# Altium footprint library Libreria PCB.PcbLib: 96 footprints (part 3 of 6)
Each footprint in its own frame and in the unit in brackets; x right, y up, seen from the top. Pads: shape width x height; smd on the part's side, far side on the other; paste and mask are expansions set on the pad; w line width, h text height; cw(c..) or ccw(c..) is an arc to the next point about the centre after c.
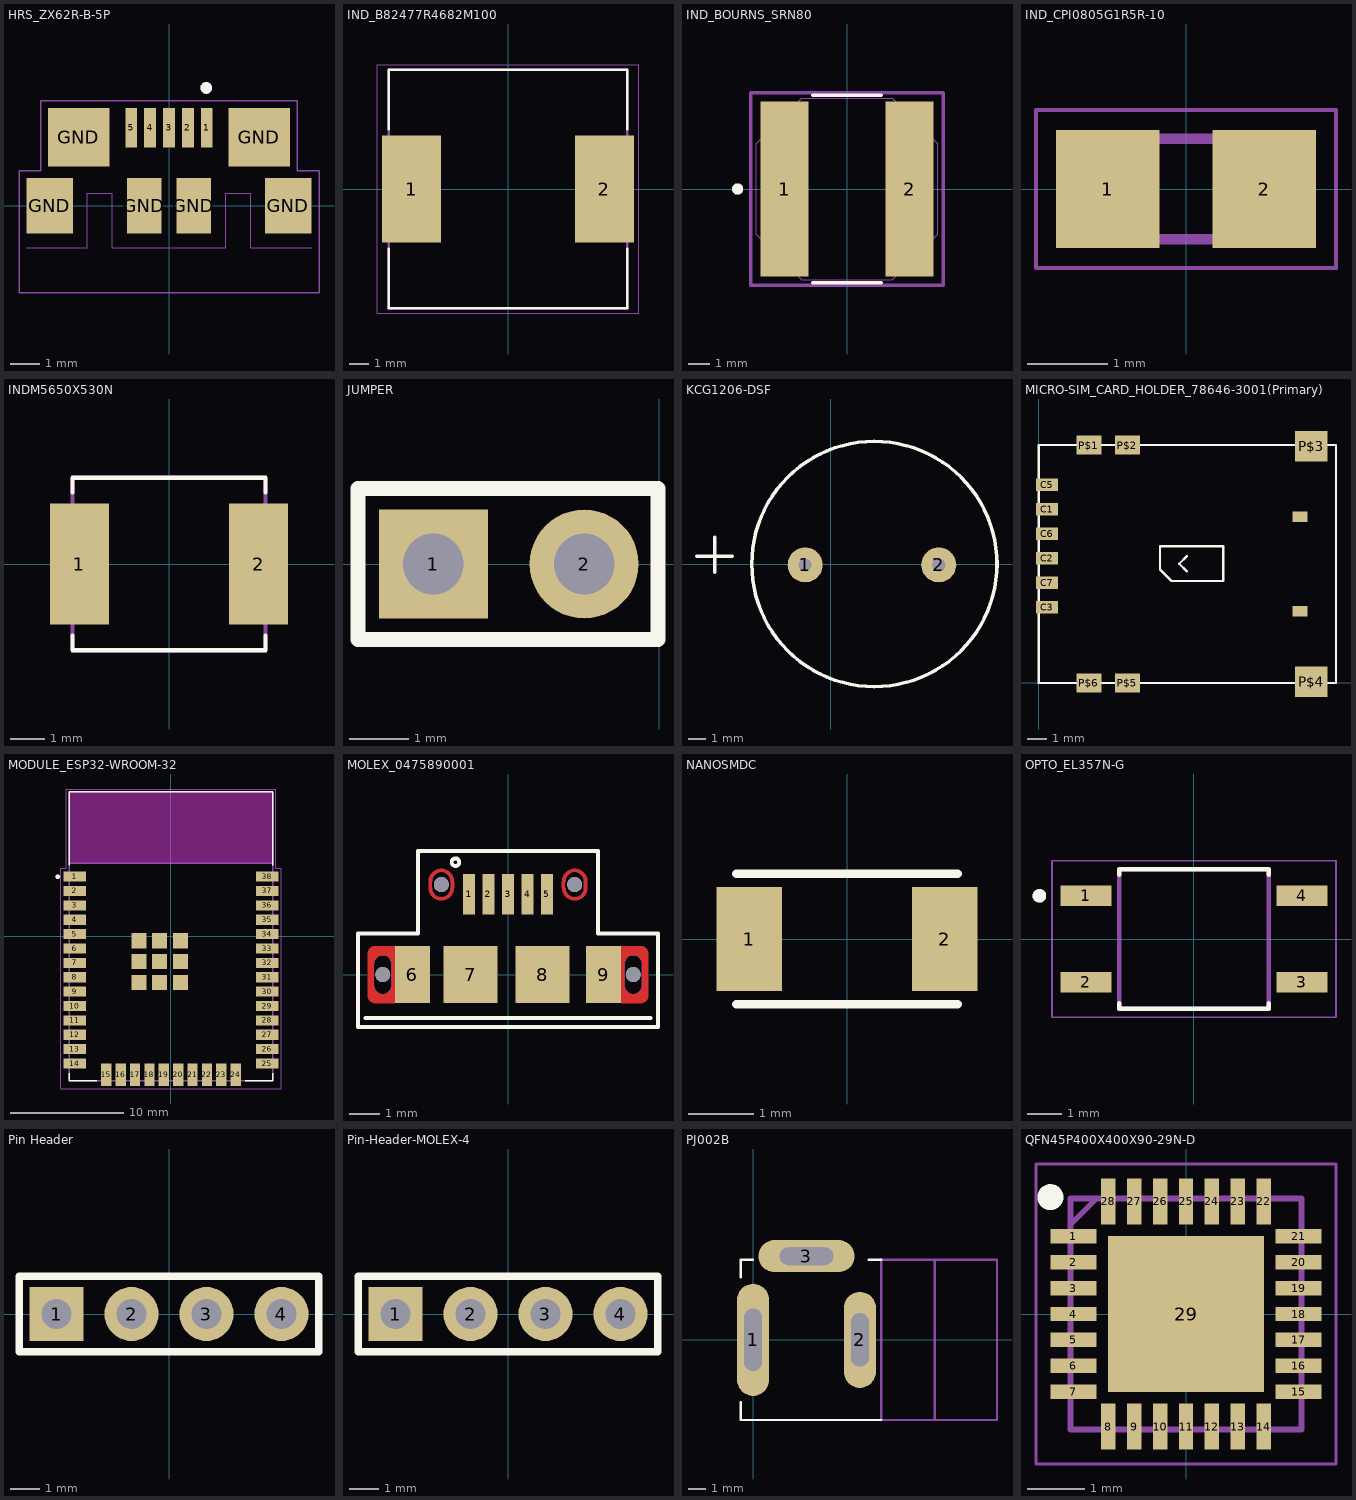
[diagram p2: the footprints below, top view; thin cyan lines are the x and y axes]

## HRS_ZX62R-B-5P [mm]
pads (11):
  rect 0.4x1.35 smd: 1(1.3,2.675) 2(0.65,2.675) 3(0,2.675) 4(-0.65,2.675) 5(-1.3,2.675)
  rect 1.6x1.9 smd: GND(-4.1,0) GND(4.1,0)
  rect 2.1x2 smd: GND(-3.1,2.35) GND(3.1,2.35)
  rect 1.2x1.9 smd: GND(-0.85,0) GND(0.85,0)
Top Overlay:
  circle w0.2: c1.28,4.04 r0.1
Mechanical 1:
  lines w0: -4.9,-1.45 -2.8,-1.45 -2.8,0.43 -1.95,0.43 -1.95,-1.45 1.95,-1.45 1.95,0.43 2.8,0.43 2.8,-1.45 4.9,-1.45
Mechanical 13:
  circle w0.2: c1.28,4.04 r0.1
Mechanical 15:
  lines w0.05: -5.15,-3 5.15,-3 5.15,1.2 4.4,1.2 4.4,3.6 -4.4,3.6 -4.4,1.2 -5.15,1.2 -5.15,-3
3D body "ZX62R-B-5P--3DModel-STEP-1.STEP": height 2.71, standoff -0.23, extent -4.4,-2.75 4.4,2.981

## IND_B82477R4682M100 [mm]
height 8.5
pads (2):
  rect 3.1x5.6 smd: 1(-5.05,0) 2(5.05,0)
Top Overlay:
  lines w0.127: -6.25,-3.12 -6.25,-6.25 6.25,-6.25 6.25,-3.12 ; -6.25,3.12 -6.25,6.25 6.25,6.25 6.25,3.12
Mechanical 13:
  lines w0.127: -6.25,-6.25 -6.25,6.25 6.25,6.25 6.25,-6.25 -6.25,-6.25
Mechanical 15:
  lines w0.05: -6.85,-6.5 -6.85,6.5 6.85,6.5 6.85,-6.5 -6.85,-6.5
3D body "step_temp.STEP": height 8.5, standoff 0, extent -6.25,-6.25 6.25,6.25

## IND_BOURNS_SRN80 [mil]
pads (2):
  rect 87x315 smd paste+0 mask+0: 1(-112.5,0) 2(112.5,0)
Top Overlay:
  circle w10: c-196.85,0 r5
  lines w6: -61.89,-168.5 61.89,-168.5 ; -61.89,168.5 61.89,168.5
Mechanical 13:
  lines w1: -163.5,-81.75 -163.5,81.75 -81.75,163.5 81.75,163.5 163.5,81.75 163.5,-81.75 81.75,-163.5 -81.75,-163.5 -163.5,-81.75
  text "*" at -143.5,0 h50
Mechanical 15:
  lines w6: -173.5,-173.5 -173.5,173.5 173.5,173.5 173.5,-173.5 -173.5,-173.5
3D body "srn8040.stp": height 157.48, standoff 0, extent -157.48,-157.48 157.49,157.48

## IND_CPI0805G1R5R-10 [mm]
pads (2):
  rect 1.285x1.47 smd: 1(-0.973,0) 2(0.973,0)
Mechanical 13:
  lines w0.127: -1,-0.625 1,-0.625 1,0.625 -1,0.625 -1,-0.625
Mechanical 15:
  lines w0.05: -1.865,-0.985 1.865,-0.985 1.865,0.985 -1.865,0.985 -1.865,-0.985
3D body "step_temp.STEP": height 1, standoff 0, extent -1,-0.625 1,0.625

## INDM5650X530N [mm]
height 5.3
pads (2):
  rect 1.71x3.51 smd: 1(-2.6,0) 2(2.6,0)
Top Overlay:
  lines w0.127: -2.8,-2.075 -2.8,-2.5 2.8,-2.5 2.8,-2.075 ; -2.8,2.075 -2.8,2.5 2.8,2.5 2.8,2.075
Mechanical 13:
  lines w0.127: -2.8,-2.5 -2.8,2.5 2.8,2.5 2.8,-2.5 -2.8,-2.5
3D body "step_temp.STEP": height 5.3, standoff 0, extent -2.927,-2.667 2.673,2.333

## JUMPER [mm] "2.54 mm pitch male header pin"
pads (2):
  rect 1.836x1.836 hole 1.02: 1(-3.81,0)
  round 1.836 hole 1.02: 2(-1.27,0)
Top Overlay:
  lines w0.254: -5.08,-1.275 -0.025,-1.275 -0.025,1.275 -5.08,1.275 -5.08,-1.275
3D body "Jumper SL2.STEP": height 9.5, standoff -2.6, extent -5.05,-1.225 -0.05,1.315

## KCG1206-DSF [mm]
pads (2):
  round 2 hole 0.75: 1(-1.45,-0.05) 2(6.175,-0.05)
Top Overlay:
  circle w0.2: c2.5,0 r7
  lines w0.2: -7.625,0.45 -5.625,0.45 ; -6.625,-0.475 -6.625,1.525
3D body "ALSRobot-BUZZER.STEP": height 9.65, standoff -4.5, extent -7.054,-6.025 8.4,5.975

## MICRO-SIM_CARD_HOLDER_78646-3001(Primary) [mm]
pads (14):
  rect 1.15x0.65 smd: C1(0.43,9.025) C2(0.43,6.485) C3(0.43,3.945) C5(0.43,10.295) C6(0.43,7.755) C7(0.43,5.215)
  rect 1.3x1 smd: P$1(2.6,12.37) P$2(4.6,12.37) P$5(4.6,0) P$6(2.6,0)
  rect 1.7x1.6 smd: P$3(14.16,12.31) P$4(14.16,0.06)
  rect 0.8x0.54 smd: P$13(13.58,3.73) P$14(13.58,8.65)
Top Overlay:
  lines w0.127: 7.7,5.8 7.3,6.2 7.7,6.6 ; 0,0 15.45,0 15.45,12.37 0,12.37 0,0 ; 6.3,5.9 6.3,7.1 9.6,7.1 9.6,5.3 6.9,5.3 6.3,5.9
3D body "786463001.stp": height 1.43, standoff -0.02, extent 0,-0.254 15.45,12.796

## MODULE_ESP32-WROOM-32 [mm]
pads (47):
  rect 2x0.9 smd: 1(-8.5,5.26) 2(-8.5,3.99) 3(-8.5,2.72) 4(-8.5,1.45) 5(-8.5,0.18) 6(-8.5,-1.09) 7(-8.5,-2.36) 8(-8.5,-3.63) 9(-8.5,-4.9) 10(-8.5,-6.17) 11(-8.5,-7.44) 12(-8.5,-8.71) 13(-8.5,-9.98) 14(-8.5,-11.25) 25(8.5,-11.25) 26(8.5,-9.98) 27(8.5,-8.71) 28(8.5,-7.44) 29(8.5,-6.17) 30(8.5,-4.9) 31(8.5,-3.63) 32(8.5,-2.36) 33(8.5,-1.09) 34(8.5,0.18) 35(8.5,1.45) 36(8.5,2.72) 37(8.5,3.99) 38(8.5,5.26)
  rect 0.9x2 smd: 15(-5.715,-12.25) 16(-4.445,-12.25) 17(-3.175,-12.25) 18(-1.905,-12.25) 19(-0.635,-12.25) 20(0.635,-12.25) 21(1.905,-12.25) 22(3.175,-12.25) 23(4.445,-12.25) 24(5.715,-12.25)
  rect 1.33x1.33 smd: 39_1(-2.835,-0.405) 39_2(-1,-0.405) 39_3(0.835,-0.405) 39_4(-2.835,-2.24) 39_5(-1,-2.24) 39_6(0.835,-2.24) 39_7(-2.835,-4.075) 39_8(-1,-4.075) 39_9(0.835,-4.075)
Top Overlay:
  circle w0.2: c-10,5.25 r0.1
  lines w0.127: -9,-12.1 -9,-12.75 -6.55,-12.75 ; -9,6.25 -9,12.75 9,12.75 9,6.25 ; 6.55,-12.75 9,-12.75 9,-12.1
Keep-Out Layer:
  region: 9,6.45 -9,6.45 -9,12.75 9,12.75
  region: 9,6.45 -9,6.45 -9,12.75 9,12.75
Mechanical 13:
  circle w0.2: c-10,5.25 r0.1
  lines w0.127: -9,6.45 -9,-12.75 9,-12.75 9,6.45 ; -9,6.45 -9,12.75 9,12.75 9,6.45 ; -9,6.45 9,6.45
  text "ANTENNA" at -6,9 h1.78
Mechanical 15:
  lines w0.05: -9.75,-13.5 9.75,-13.5 9.75,6 9.25,6 9.25,13 -9.25,13 -9.25,6 -9.75,6 -9.75,-13.5
3D body "step_temp.STEP": height 3.2, standoff 0, extent -9,-12.75 9,12.75

## MOLEX_0475890001 [mm]
pads (13):
  rect 0.4x1.35 smd: 1(-1.3,2.675) 2(-0.65,2.675) 3(0,2.675) 4(0.65,2.675) 5(1.3,2.675)
  rect 1.175x1.9 smd: 6(-3.187,0) 9(3.187,0)
  rect 1.8x1.9 smd: 7(-1.25,0) 8(1.15,0)
  round 0.5 hole 0.5 unplated: ""(-4.175,0) ""(-2.225,3) ""(2.225,3) ""(4.175,0)
Top Layer:
  region: 3.875,0.35 3.875,-0.35 3.875,-0.95 3.775,-0.95 3.775,0.95 3.875,0.95
  region: 186 vertices and 0 holes, not listed, extent 3.875,-0.95 4.675,0.95
  region: -3.775,-0.95 -3.875,-0.95 -3.875,-0.35 -3.875,0.35 -3.875,0.95 -3.775,0.95
  region: 2.65,2.9 2.649,2.878 2.648,2.856 2.645,2.834 2.641,2.812 2.636,2.79 2.629,2.769 2.622,2.748 2.613,2.727 2.604,2.707 2.593,2.688 2.581,2.669 2.569,2.65 2.555,2.633 2.541,2.616 2.526,2.599 2.509,2.584 2.492,2.57 2.475,2.556 2.456,2.544 2.438,2.532 2.418,2.521 2.398,2.512 2.377,2.503 2.356,2.496 2.335,2.489 2.313,2.484 2.291,2.48 2.269,2.477 2.247,2.476 2.225,2.475 2.203,2.476 2.181,2.477 2.159,2.48 2.137,2.484 2.115,2.489 2.094,2.496 2.073,2.503 2.052,2.512 2.032,2.521 2.013,2.532 1.994,2.544 1.975,2.556 1.958,2.57 1.941,2.584 1.924,2.599 1.909,2.616 1.895,2.633 1.881,2.65 1.869,2.669 1.857,2.688 1.846,2.707 1.837,2.727 1.828,2.748 1.821,2.769 1.814,2.79 1.809,2.812 1.805,2.834 1.802,2.856 1.801,2.878 1.8,2.9 1.8,3 1.9,3 1.9,2.9 1.9,2.883 1.902,2.866 1.904,2.849 1.907,2.832 1.911,2.816 1.916,2.8 1.922,2.784 1.928,2.768 1.935,2.752 1.944,2.738 1.952,2.723 1.962,2.709 1.972,2.695 1.983,2.683 1.995,2.67 2.008,2.658 2.02,2.647 2.034,2.637 2.048,2.627 2.063,2.619 2.077,2.61 2.093,2.603 2.109,2.597 2.125,2.591 2.141,2.586 2.157,2.582 2.174,2.579 2.191,2.577 2.208,2.575 2.225,2.575 2.242,2.575 2.259,2.577 2.276,2.579 2.293,2.582 2.309,2.586 2.325,2.591 2.341,2.597 2.357,2.603 2.373,2.61 2.388,2.619 2.402,2.627 2.416,2.637 2.43,2.647 2.442,2.658 2.455,2.67 2.467,2.683 2.478,2.695 2.488,2.709 2.498,2.723 2.506,2.738 2.515,2.752 2.522,2.768 2.528,2.784 2.534,2.8 2.539,2.816 2.543,2.832 2.546,2.849 2.548,2.866 2.55,2.883 2.55,2.9 2.55,3 2.65,3
  region: 2.247,3.524 2.269,3.523 2.291,3.52 2.313,3.516 2.335,3.511 2.356,3.504 2.377,3.497 2.398,3.488 2.418,3.479 2.438,3.468 2.456,3.456 2.475,3.444 2.492,3.43 2.509,3.416 2.526,3.401 2.541,3.384 2.555,3.367 2.569,3.35 2.581,3.331 2.593,3.313 2.604,3.293 2.613,3.273 2.622,3.252 2.629,3.231 2.636,3.21 2.641,3.188 2.645,3.166 2.648,3.144 2.649,3.122 2.65,3.1 2.65,3 2.55,3 2.55,3.1 2.55,3.117 2.548,3.134 2.546,3.151 2.543,3.168 2.539,3.184 2.534,3.2 2.528,3.216 2.522,3.232 2.515,3.248 2.506,3.263 2.498,3.277 2.488,3.291 2.478,3.305 2.467,3.317 2.455,3.33 2.442,3.342 2.43,3.353 2.416,3.363 2.402,3.373 2.388,3.381 2.373,3.39 2.357,3.397 2.341,3.403 2.325,3.409 2.309,3.414 2.293,3.418 2.276,3.421 2.259,3.423 2.242,3.425 2.225,3.425 2.208,3.425 2.191,3.423 2.174,3.421 2.157,3.418 2.141,3.414 2.125,3.409 2.109,3.403 2.093,3.397 2.077,3.39 2.063,3.381 2.048,3.373 2.034,3.363 2.02,3.353 2.008,3.342 1.995,3.33 1.983,3.317 1.972,3.305 1.962,3.291 1.952,3.277 1.944,3.263 1.935,3.248 1.928,3.232 1.922,3.216 1.916,3.2 1.911,3.184 1.907,3.168 1.904,3.151 1.902,3.134 1.9,3.117 1.9,3.1 1.9,3 1.8,3 1.8,3.1 1.801,3.122 1.802,3.144 1.805,3.166 1.809,3.188 1.814,3.21 1.821,3.231 1.828,3.252 1.837,3.273 1.846,3.293 1.857,3.313 1.869,3.331 1.881,3.35 1.895,3.367 1.909,3.384 1.924,3.401 1.941,3.416 1.958,3.43 1.975,3.444 1.994,3.456 2.013,3.468 2.032,3.479 2.052,3.488 2.073,3.497 2.094,3.504 2.115,3.511 2.137,3.516 2.159,3.52 2.181,3.523 2.203,3.524 2.225,3.525
  region: -1.8,2.9 -1.801,2.878 -1.802,2.856 -1.805,2.834 -1.809,2.812 -1.814,2.79 -1.821,2.769 -1.828,2.748 -1.837,2.727 -1.846,2.707 -1.857,2.688 -1.869,2.669 -1.881,2.65 -1.895,2.633 -1.909,2.616 -1.924,2.599 -1.941,2.584 -1.958,2.57 -1.975,2.556 -1.994,2.544 -2.013,2.532 -2.032,2.521 -2.052,2.512 -2.073,2.503 -2.094,2.496 -2.115,2.489 -2.137,2.484 -2.159,2.48 -2.181,2.477 -2.203,2.476 -2.225,2.475 -2.247,2.476 -2.269,2.477 -2.291,2.48 -2.313,2.484 -2.335,2.489 -2.356,2.496 -2.377,2.503 -2.398,2.512 -2.418,2.521 -2.438,2.532 -2.456,2.544 -2.475,2.556 -2.492,2.57 -2.509,2.584 -2.526,2.599 -2.541,2.616 -2.555,2.633 -2.569,2.65 -2.581,2.669 -2.593,2.688 -2.604,2.707 -2.613,2.727 -2.622,2.748 -2.629,2.769 -2.636,2.79 -2.641,2.812 -2.645,2.834 -2.648,2.856 -2.649,2.878 -2.65,2.9 -2.65,3 -2.55,3 -2.55,2.9 -2.55,2.883 -2.548,2.866 -2.546,2.849 -2.543,2.832 -2.539,2.816 -2.534,2.8 -2.528,2.784 -2.522,2.768 -2.515,2.752 -2.506,2.738 -2.498,2.723 -2.488,2.709 -2.478,2.695 -2.467,2.683 -2.455,2.67 -2.442,2.658 -2.43,2.647 -2.416,2.637 -2.402,2.627 -2.388,2.619 -2.373,2.61 -2.357,2.603 -2.341,2.597 -2.325,2.591 -2.309,2.586 -2.293,2.582 -2.276,2.579 -2.259,2.577 -2.242,2.575 -2.225,2.575 -2.208,2.575 -2.191,2.577 -2.174,2.579 -2.157,2.582 -2.141,2.586 -2.125,2.591 -2.109,2.597 -2.093,2.603 -2.077,2.61 -2.063,2.619 -2.048,2.627 -2.034,2.637 -2.02,2.647 -2.008,2.658 -1.995,2.67 -1.983,2.683 -1.972,2.695 -1.962,2.709 -1.952,2.723 -1.944,2.738 -1.935,2.752 -1.928,2.768 -1.922,2.784 -1.916,2.8 -1.911,2.816 -1.907,2.832 -1.904,2.849 -1.902,2.866 -1.9,2.883 -1.9,2.9 -1.9,3 -1.8,3
  region: -2.203,3.524 -2.181,3.523 -2.159,3.52 -2.137,3.516 -2.115,3.511 -2.094,3.504 -2.073,3.497 -2.052,3.488 -2.032,3.479 -2.013,3.468 -1.994,3.456 -1.975,3.444 -1.958,3.43 -1.941,3.416 -1.924,3.401 -1.909,3.384 -1.895,3.367 -1.881,3.35 -1.869,3.331 -1.857,3.313 -1.846,3.293 -1.837,3.273 -1.828,3.252 -1.821,3.231 -1.814,3.21 -1.809,3.188 -1.805,3.166 -1.802,3.144 -1.801,3.122 -1.8,3.1 -1.8,3 -1.9,3 -1.9,3.1 -1.9,3.117 -1.902,3.134 -1.904,3.151 -1.907,3.168 -1.911,3.184 -1.916,3.2 -1.922,3.216 -1.928,3.232 -1.935,3.248 -1.944,3.263 -1.952,3.277 -1.962,3.291 -1.972,3.305 -1.983,3.317 -1.995,3.33 -2.008,3.342 -2.02,3.353 -2.034,3.363 -2.048,3.373 -2.063,3.381 -2.077,3.39 -2.093,3.397 -2.109,3.403 -2.125,3.409 -2.141,3.414 -2.157,3.418 -2.174,3.421 -2.191,3.423 -2.208,3.425 -2.225,3.425 -2.242,3.425 -2.259,3.423 -2.276,3.421 -2.293,3.418 -2.309,3.414 -2.325,3.409 -2.341,3.403 -2.357,3.397 -2.373,3.39 -2.388,3.381 -2.402,3.373 -2.416,3.363 -2.43,3.353 -2.442,3.342 -2.455,3.33 -2.467,3.317 -2.478,3.305 -2.488,3.291 -2.498,3.277 -2.506,3.263 -2.515,3.248 -2.522,3.232 -2.528,3.216 -2.534,3.2 -2.539,3.184 -2.543,3.168 -2.546,3.151 -2.548,3.134 -2.55,3.117 -2.55,3.1 -2.55,3 -2.65,3 -2.65,3.1 -2.649,3.122 -2.648,3.144 -2.645,3.166 -2.641,3.188 -2.636,3.21 -2.629,3.231 -2.622,3.252 -2.613,3.273 -2.604,3.293 -2.593,3.313 -2.581,3.331 -2.569,3.35 -2.555,3.367 -2.541,3.384 -2.526,3.401 -2.509,3.416 -2.492,3.43 -2.475,3.444 -2.456,3.456 -2.438,3.468 -2.418,3.479 -2.398,3.488 -2.377,3.497 -2.356,3.504 -2.335,3.511 -2.313,3.516 -2.291,3.52 -2.269,3.523 -2.247,3.524 -2.225,3.525
  region: 186 vertices and 0 holes, not listed, extent -4.675,-0.95 -3.875,0.95
Top Overlay:
  circle w0.127: c-1.75,3.75 r0.127
  lines w0.127: -4.75,-1.45 4.75,-1.45 ; -5,-1.75 -5,1.375 -3,1.375 -3,4.125 3,4.125 3,1.375 5,1.375 5,-1.75 -5,-1.75
Top Paste:
  lines w0.1: -2.6,2.9 ccw(c-2.225,2.9) -2.225,2.525 ccw(c-2.225,2.9) -1.85,2.9 -1.85,3.1 ccw(c-2.225,3.1) -2.225,3.475 ccw(c-2.225,3.1) -2.6,3.1 -2.6,2.9 ; 1.85,2.9 ccw(c2.225,2.9) 2.225,2.525 ccw(c2.225,2.9) 2.6,2.9 2.6,3.1 ccw(c2.225,3.1) 2.225,3.475 ccw(c2.225,3.1) 1.85,3.1 1.85,2.9
  lines w0.2: -4.175,-0.75 cw(c-4.175,-0.35) -4.575,-0.35 -4.575,0.35 cw(c-4.175,0.35) -4.175,0.75 ; 4.175,-0.75 ccw(c4.175,-0.35) 4.575,-0.35 4.575,0.35 ccw(c4.175,0.35) 4.175,0.75 ; -4.575,-0.7 ccw(c-4.425,-0.7) -4.425,-0.85 -3.675,-0.85 -3.675,0.85 -4.425,0.85 ccw(c-4.425,0.7) -4.575,0.7 -4.575,-0.7 ; 3.675,-0.85 3.675,0.85 4.425,0.85 cw(c4.425,0.7) 4.575,0.7 4.575,-0.7 cw(c4.425,-0.7) 4.425,-0.85 3.675,-0.85
  lines w0.3: -4.175,-0.8 ccw(c-4.175,-0.35) -3.725,-0.35 -3.725,0.35 ccw(c-4.175,0.35) -4.175,0.8 ; 4.175,-0.8 cw(c4.175,-0.35) 3.725,-0.35 3.725,0.35 cw(c4.175,0.35) 4.175,0.8
Top Solder:
  lines w0.2: -4.675,-0.7 ccw(c-4.425,-0.7) -4.425,-0.95 -3.675,-0.95 -3.675,0.95 -4.425,0.95 ccw(c-4.425,0.7) -4.675,0.7 -4.675,-0.7 ; -2.65,2.9 ccw(c-2.225,2.9) -2.225,2.475 ccw(c-2.225,2.9) -1.8,2.9 -1.8,3.1 ccw(c-2.225,3.1) -2.225,3.525 ccw(c-2.225,3.1) -2.65,3.1 -2.65,2.9 ; 1.8,2.9 ccw(c2.225,2.9) 2.225,2.475 ccw(c2.225,2.9) 2.65,2.9 2.65,3.1 ccw(c2.225,3.1) 2.225,3.525 ccw(c2.225,3.1) 1.8,3.1 1.8,2.9 ; 3.675,-0.95 3.675,0.95 4.425,0.95 cw(c4.425,0.7) 4.675,0.7 4.675,-0.7 cw(c4.425,-0.7) 4.425,-0.95 3.675,-0.95
  lines w0.3: -4.625,-0.35 ccw(c-4.175,-0.35) -4.175,-0.8 ccw(c-4.175,-0.35) -3.725,-0.35 -3.725,0.35 ccw(c-4.175,0.35) -4.175,0.8 ccw(c-4.175,0.35) -4.625,0.35 -4.625,-0.35 ; 3.725,-0.35 ccw(c4.175,-0.35) 4.175,-0.8 ccw(c4.175,-0.35) 4.625,-0.35 4.625,0.35 ccw(c4.175,0.35) 4.175,0.8 ccw(c4.175,0.35) 3.725,0.35 3.725,-0.35
Mechanical 1:
  lines w0: -4.475,-0.35 ccw(c-4.175,-0.35) -4.175,-0.65 ccw(c-4.175,-0.35) -3.875,-0.35 -3.875,0.35 ccw(c-4.175,0.35) -4.175,0.65 ccw(c-4.175,0.35) -4.475,0.35 -4.475,-0.35 ; -2.55,2.9 ccw(c-2.225,2.9) -2.225,2.575 ccw(c-2.225,2.9) -1.9,2.9 -1.9,3.1 ccw(c-2.225,3.1) -2.225,3.425 ccw(c-2.225,3.1) -2.55,3.1 -2.55,2.9 ; 1.9,2.9 ccw(c2.225,2.9) 2.225,2.575 ccw(c2.225,2.9) 2.55,2.9 2.55,3.1 ccw(c2.225,3.1) 2.225,3.425 ccw(c2.225,3.1) 1.9,3.1 1.9,2.9 ; 3.875,-0.35 ccw(c4.175,-0.35) 4.175,-0.65 ccw(c4.175,-0.35) 4.475,-0.35 4.475,0.35 ccw(c4.175,0.35) 4.175,0.65 ccw(c4.175,0.35) 3.875,0.35 3.875,-0.35
Mechanical 13:
  lines w0: -4.475,-0.35 -4.475,0.35 ; -3.875,-0.35 -3.875,0.35 ; -2.55,2.9 -2.55,3.1 ; -1.9,2.9 -1.9,3.1 ; 1.9,2.9 1.9,3.1 ; 2.55,2.9 2.55,3.1 ; 3.875,-0.35 3.875,0.35 ; 4.475,-0.35 4.475,0.35
3D body "MICRO-USB-AB.STEP": height 2.67, standoff -0.27, extent -4.75,-2.53 4.75,3.41

## NANOSMDC [mm]
pads (2):
  rect 1x1.6 smd: 1(-1.5,0) 2(1.5,0)
Top Overlay:
  lines w0.127: -1.7,-1 1.7,-1 ; -1.7,1 1.7,1
3D body "User Library-FUSER_nanoSMD.STEP": height 1, standoff 0, extent -1.603,-0.8 1.602,0.8

## OPTO_EL357N-G [mm]
pads (4):
  rect 1.5x0.6 smd: 1(-3.175,1.27) 2(-3.175,-1.27) 3(3.175,-1.27) 4(3.175,1.27)
Top Overlay:
  circle w0.2: c-4.544,1.27 r0.1
  lines w0.127: -2.2,-1.89 -2.2,-2.05 2.2,-2.05 2.2,-1.89 ; -2.2,1.89 -2.2,2.05 2.2,2.05 2.2,1.89
Mechanical 13:
  circle w0.2: c-4.544,1.27 r0.1
  lines w0.127: -2.2,-2.05 2.2,-2.05 2.2,2.05 -2.2,2.05 -2.2,-2.05
Mechanical 15:
  lines w0.05: -4.175,-2.3 4.175,-2.3 4.175,2.3 -4.175,2.3 -4.175,-2.3

## Pin Header [mm] "2.54 mm pitch male header pin"
pads (4):
  rect 1.836x1.836 hole 1.02: 1(-3.81,0)
  round 1.836 hole 1.02: 2(-1.27,0) 3(1.27,0) 4(3.81,0)
Top Overlay:
  lines w0.254: -5.08,-1.275 -5.08,1.275 5.08,1.275 5.08,-1.275 -5.08,-1.275

## Pin-Header-MOLEX-4 [mm] "2.54 mm pitch male header pin"
pads (4):
  rect 1.836x1.836 hole 1.02: 1(-3.81,0)
  round 1.836 hole 1.02: 2(-1.27,0) 3(1.27,0) 4(3.81,0)
Top Overlay:
  lines w0.254: -5.08,-1.275 -5.08,1.275 5.08,1.275 5.08,-1.275 -5.08,-1.275
3D body "molex kk 0_1in latching 4 way vertical header.STEP": height 11.7, standoff -3.54, extent -5.08,-3 5.08,2.842

## PJ002B [mm]
pads (3):
  oval 1.8x6.3 hole 1 slot 3.5 at 90 deg: 1(0,0)
  oval 1.8x5.4 hole 1 slot 3 at 90 deg: 2(6,0)
  oval 5.4x1.8 hole 1 slot 3 at 0 deg: 3(3,4.7)
Top Overlay:
  lines w0.127: -0.7,-3.5 -0.7,-4.5 7.2,-4.5 ; -0.7,3.5 -0.7,4.5 0,4.5 ; 6.5,4.5 7.2,4.5
Mechanical 4:
  lines w0.127: 10.2,-4.5 10.2,4.5 ; 7.2,-4.5 7.2,4.5 13.7,4.5 13.7,-4.5 7.2,-4.5
3D body "User Library-PJ-002AH.STEP": height 11.05, standoff -3.45, extent -0.7,-4.7 13.7,4.7

## QFN45P400X400X90-29N-D [mm]
pads (29):
  rect 0.8x0.25 smd: 1(-1.95,1.35) 2(-1.95,0.9) 3(-1.95,0.45) 4(-1.95,0) 5(-1.95,-0.45) 6(-1.95,-0.9) 7(-1.95,-1.35) 15(1.95,-1.35) 16(1.95,-0.9) 17(1.95,-0.45) 18(1.95,0) 19(1.95,0.45) 20(1.95,0.9) 21(1.95,1.35)
  rect 0.25x0.8 smd: 8(-1.35,-1.95) 9(-0.9,-1.95) 10(-0.45,-1.95) 11(0,-1.95) 12(0.45,-1.95) 13(0.9,-1.95) 14(1.35,-1.95) 22(1.35,1.95) 23(0.9,1.95) 24(0.45,1.95) 25(0,1.95) 26(-0.45,1.95) 27(-0.9,1.95) 28(-1.35,1.95)
  rect 2.7x2.7 smd: 29(0,0)
Top Overlay:
  circle w0.225: c-2.351,2.025 r0.112
Mechanical 15:
  lines w0.1: -2,1.55 -1.55,2 ; -2,-2 -2,2 2,2 2,-2 -2,-2
Mechanical 20:
  lines w0.05: -2.6,-2.6 -2.6,2.6 2.6,2.6 2.6,-2.6 -2.6,-2.6
3D body "ES8388.stp": height 0.9, standoff 0, extent -2.05,-2.05 2.05,2.05